# Altium footprint library Power_DiscreteSSR1.PcbLib: 45 footprints (part 2 of 3)
Each footprint in its own frame and in the unit in brackets; x right, y up, seen from the top. Pads: shape width x height; smd on the part's side, far side on the other; paste and mask are expansions set on the pad; w line width, h text height; cw(c..) or ccw(c..) is an arc to the next point about the centre after c.
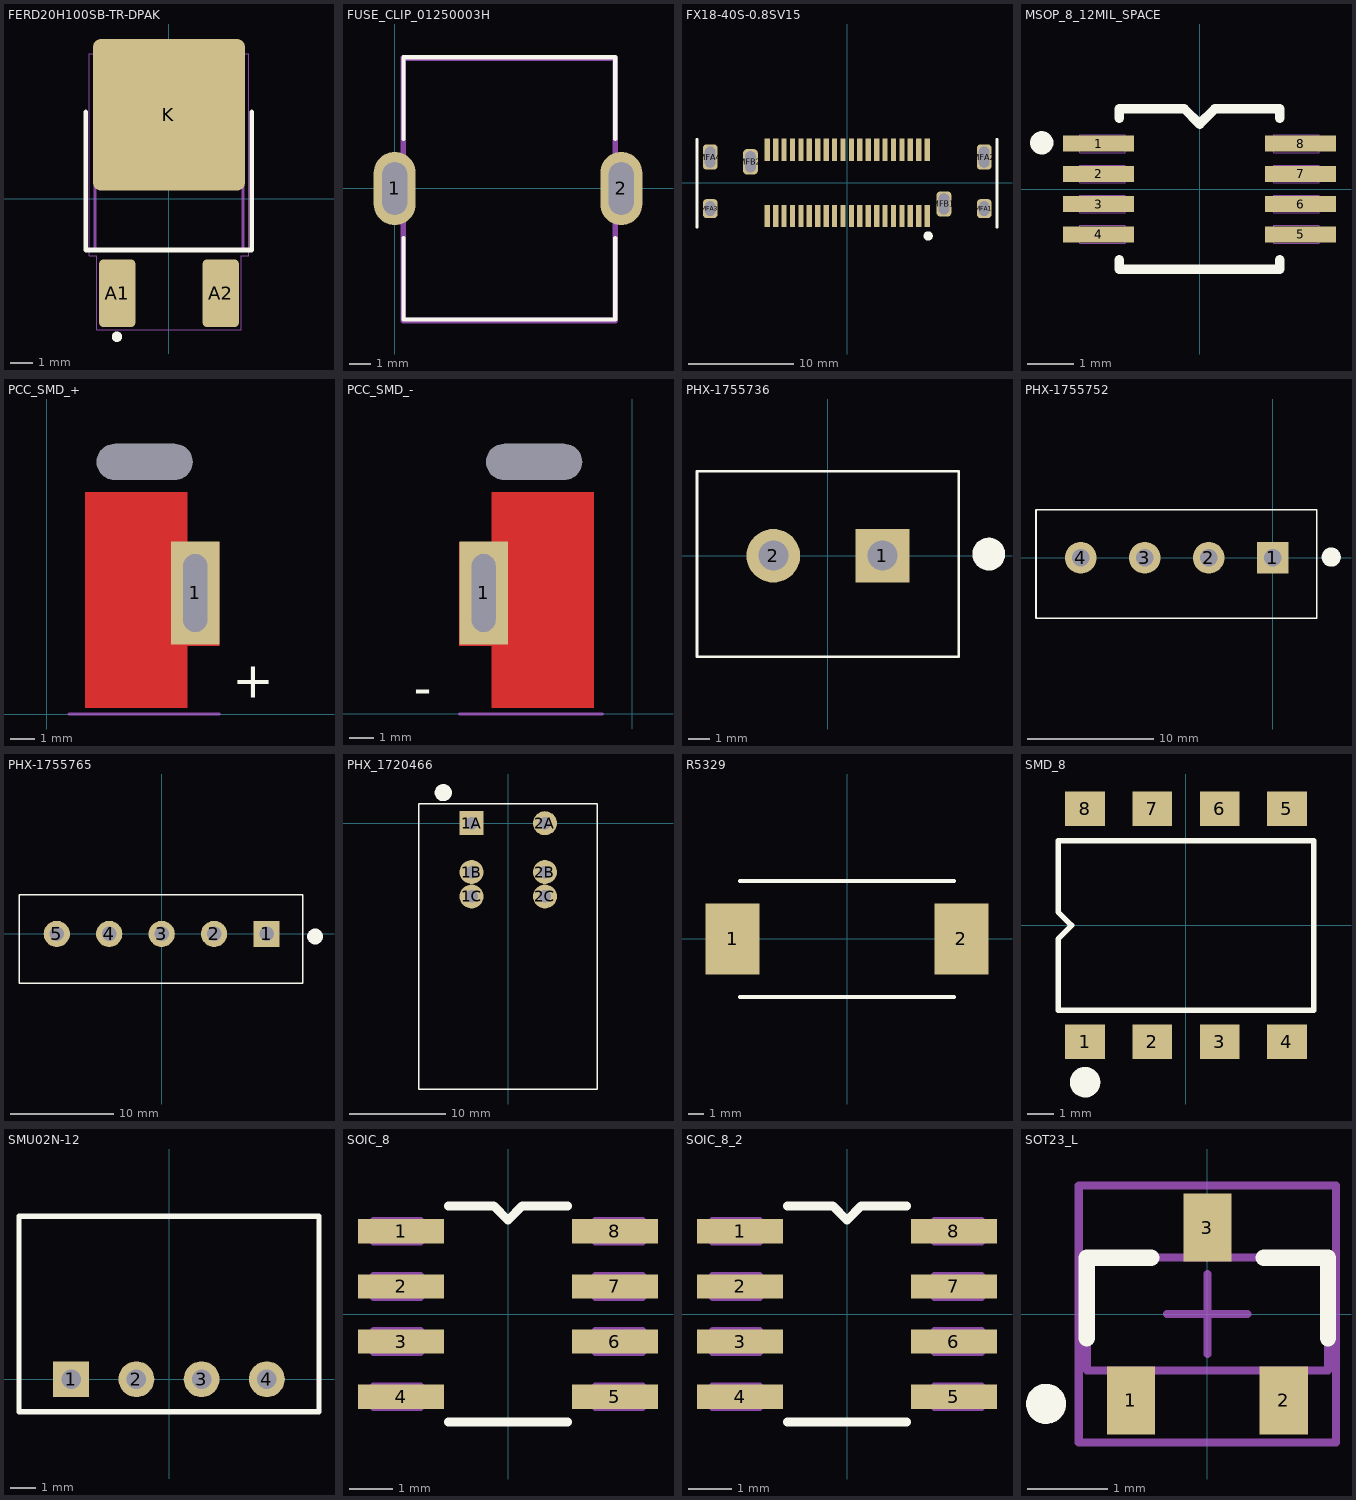
[diagram p1: the footprints below, top view; thin cyan lines are the x and y axes]

## FERD20H100SB-TR-DPAK [mm] "DIODE RECT 100V 20A DPAK"
pads (3):
  rrect25% 1.6x3 smd: A1(-2.286,-4.18) A2(2.286,-4.18)
  rrect10% 6.7x6.7 smd paste-4: K(0,3.7)
Top Overlay:
  circle w0.2: c-2.3,-6.1 r0.1
  circle w0.254: c-2.3,-6.1 r0.1
  lines w0.203: -3.683,3.825 -3.683,-2.27 3.658,-2.27 3.658,3.825
Top Paste:
  region: -0.53,3.15 -2.29,3.15 -2.29,5.03 -0.53,5.03
  region: 2.29,3.15 0.53,3.15 0.53,5.03 2.29,5.03
  region: -0.53,0.21 -2.29,0.21 -2.29,2.09 -0.53,2.09
  region: 2.29,0.21 0.53,0.21 0.53,2.09 2.29,2.09
Mechanical 13:
  circle w0.2: c-2.3,-6.1 r0.1
  lines w0.127: -3.27,-2.27 3.27,-2.27 3.27,3.825 -3.27,3.825 -3.27,-2.27
Mechanical 15:
  lines w0.05: -3.52,-2.52 -3.52,6.4 3.52,6.4 3.52,-2.52 3.2,-2.52 3.2,-5.8 -3.2,-5.8 -3.2,-2.52 -3.52,-2.52
3D body "FERD20H100SB-TR--3DModel-STEP-56544.STEP": height 2.4, standoff -0.23, extent -3.24,-4.375 3.3,5.5

## FUSE_CLIP_01250003H [mm]
pads (2):
  oval 2x3.5 hole 1.2 slot 2.5 at 90 deg: 1(0,0) 2(10.8,0)
Top Overlay:
  lines w0.203: 0.416,-2.362 0.416,-6.25 10.516,-6.25 10.516,-2.362 ; 0.416,2.362 0.416,6.25 10.516,6.25 10.516,2.362
Mechanical 15:
  lines w0.254: 0.413,-6.301 0.413,6.199 10.513,6.199 10.513,-6.301 0.413,-6.301 ; 0.413,-6.275 0.413,6.225 10.513,6.225 10.513,-6.275 0.413,-6.275
3D body: height 18.5, standoff 0, extent 0.406,-6.249 10.541,-3.208
3D body: height 3.5, standoff 0, extent 0.406,-6.248 10.516,6.248
3D body: height 18.5, standoff 0, extent 0.415,3.211 10.516,6.249

## FX18-40S-0.8SV15 [mm] "CONN RCPT 40POS SMD GOLD"
pads (46):
  rect 0.5x2.1 smd: 1(7.6,-3.15) 2(6.8,-3.15) 3(6,-3.15) 4(5.2,-3.15) 5(4.4,-3.15) 6(3.6,-3.15) 7(2.8,-3.15) 8(2,-3.15) 9(1.2,-3.15) 10(0.4,-3.15) 11(-0.4,-3.15) 12(-1.2,-3.15) 13(-2,-3.15) 14(-2.8,-3.15) 15(-3.6,-3.15) 16(-4.4,-3.15) 17(-5.2,-3.15) 18(-6,-3.15) 19(-6.8,-3.15) 20(-7.6,-3.15) 21(7.6,3.15) 22(6.8,3.15) 23(6,3.15) 24(5.2,3.15) 25(4.4,3.15) 26(3.6,3.15) 27(2.8,3.15) 28(2,3.15) 29(1.2,3.15) 30(0.4,3.15) 31(-0.4,3.15) 32(-1.2,3.15) 33(-2,3.15) 34(-2.8,3.15) 35(-3.6,3.15) 36(-4.4,3.15) 37(-5.2,3.15) 38(-6,3.15) 39(-6.8,3.15) 40(-7.6,3.15)
  rrect50% 1.4x1.8 hole 1.4 slot 1 at 0 deg: MFA1(13.025,-2.45) MFA3(-13.025,-2.45)
  rrect50% 1.4x2.4 hole 2 slot 1 at 0 deg: MFA2(13.025,2.45) MFA4(-13.025,2.45) MFB1(9.2,-2) MFB2(-9.2,2)
Top Overlay:
  circle w0.254: c7.7,-5.05 r0.1
  circle w0.254: c7.7,-5.05 r0.316
  lines w0.254: -14.28,-4.223 -14.28,4.159 ; 14.244,-4.223 14.244,4.159
3D body "FX18-40S-0.8SV15.stp": height 11.83, standoff -1.27, extent -13.95,-3.95 13.95,3.85

## MSOP_8_12MIL_SPACE [mil]
pads (8):
  rect 60x13.59 smd mask+3: 1(-85.5,38.39)
  rect 60x13.59 smd paste+0 mask+3: 2(-85.5,12.8) 3(-85.5,-12.8) 4(-85.5,-38.39) 5(85.5,-38.39) 6(85.5,-12.8) 7(85.5,12.8) 8(85.5,38.39)
Top Overlay:
  circle w9.84: c-133.58,39.11 r4.92
  lines w8: -68,-59.99 -68,-68 68,-68 68,-59.99 ; -68,59.99 -68,68 -13,68 0,55 13,68 68,68 68,59.99
Mechanical 13:
  lines w1: -101.5,-45.89 -101.5,-30.89 -63,-30.89 -63,-45.89 -101.5,-45.89 ; -101.5,-20.3 -101.5,-5.3 -63,-5.3 -63,-20.3 -101.5,-20.3 ; -101.5,5.3 -101.5,20.3 -63,20.3 -63,5.3 -101.5,5.3 ; -101.5,30.89 -101.5,45.89 -63,45.89 -63,30.89 -101.5,30.89 ; 63,-45.89 63,-30.89 101.5,-30.89 101.5,-45.89 63,-45.89 ; 63,-20.3 63,-5.3 101.5,-5.3 101.5,-20.3 63,-20.3 ; 63,5.3 63,20.3 101.5,20.3 101.5,5.3 63,5.3 ; 63,30.89 63,45.89 101.5,45.89 101.5,30.89 63,30.89
3D body "RM_8_ADI.step": height 43.11, standoff 0, extent -101.49,-62.99 101.5,63

## PCC_SMD_+ [mm] "Thermocouple connector"
height 2.286
pads (2):
  rect 2.032x4.318 hole 1 slot 3.25 at 90 deg: 1(6.2,5.05)
  rect 0x0 hole 1.5 slot 4 at 0 deg unplated paste-4 mask+0: 4(4.09,10.52)
Top Layer:
  region: 1.6,9.246 1.6,0.254 5.867,0.254 5.867,2.84 7.21,2.84 7.21,7.16 5.867,7.16 5.867,9.246
Top Overlay:
  text "+" at 7.747,0.686 h1.52
Mechanical 1:
  lines w0.127: 0.94,0 7.21,0
  text "R: 15.74mil (0.4mm) all" at 0.584,11.963 h1.02
  text "board edge" at 1.93,-1.651 h1.02
3D body: height 2.4, standoff 0, extent 1.626,-0.686 6.68,11.227

## PCC_SMD_- [mm] "Thermocouple connector"
height 2.286
pads (2):
  rect 2.032x4.318 hole 1 slot 3.25 at 90 deg: 1(-6.2,5.05)
  rect 0x0 hole 1.5 slot 4 at 0 deg unplated paste-4 mask+0: 3(-4.09,10.52)
Top Layer:
  region: -5.867,9.246 -1.6,9.246 -1.6,0.254 -5.867,0.254 -5.867,2.84 -7.21,2.84 -7.21,7.16 -5.867,7.16
Top Overlay:
  text "-" at -9.119,0.356 h1.52
Mechanical 1:
  lines w0.127: -7.214,0 -1.245,0
  text "R: 15.74mil (0.4mm) all" at -9.652,12.014 h1.02
  text "board edge" at -6.426,-1.6 h1.02
3D body: height 2.4, standoff 0, extent -6.68,-0.66 -1.626,11.227

## PHX-1755736 [mm] "TERM BLOCK HDR 2POS VERT 5.08MM"
pads (2):
  rect 2.5x2.5 hole 1.397 mask+0: 1(2.54,0)
  round 2.5 hole 1.397 mask+0: 2(-2.54,0)
Top Overlay:
  circle w0.762: c7.493,0.076 r0.381
  lines w0.127: -6.096,-4.699 6.096,-4.699 6.096,3.927 -6.096,3.927 -6.096,-4.699
3D body "1755736--3DModel-STEP-56544.STEP": height 12.15, standoff -4.1, extent -6.08,-4.666 6.08,3.904

## PHX-1755752 [mm] "TERM BLOCK HDR 4POS VERT 5.08MM"
pads (4):
  rect 2.5x2.5 hole 1.397 mask+0: 1(0,0)
  round 2.5 hole 1.397 mask+0: 2(-5.08,0) 3(-10.16,0) 4(-15.24,0)
Top Overlay:
  circle w0.762: c4.648,0.051 r0.381
  lines w0.127: -18.796,-4.801 -18.796,3.81 ; -18.787,-4.801 3.515,-4.801 3.515,3.81 -18.787,3.81
3D body "pxc_1755752_04_MSTBVA-2-5-4-G-5-08_3D.stp": height 12, standoff -3.9, extent -18.796,-4.79 3.524,3.81

## PHX-1755765 [mil] "TERM BLOCK HDR 5POS VERT 5.08MM"
pads (5):
  rect 100x100 / inner round 75 / far side round 75 hole 55 mask+0: 1(400,0)
  round 100 / inner round 75 / far side round 75 hole 55 mask+0: 2(200,0) 3(0,0) 4(-200,0) 5(-400,0)
Top Overlay:
  circle w30: c585,-10 r15
  lines w5: -544,-189 538.37,-189 538.37,150 -544,150 -544,-189
3D body "pxc_1755765_04_MSTBVA-2-5-5-G-5-08_3D.stp": height 472.44, standoff -153.54, extent -540.37,-188.79 538.37,149.79

## PHX_1720466 [mm]
pads (6):
  rect 2.5x2.5 hole 1.3 mask+0: 1A(-3.81,0)
  round 2.5 hole 1.3 mask+0: 1B(-3.81,-5.08) 1C(-3.81,-7.62) 2A(3.81,0) 2B(3.81,-5.08) 2C(3.81,-7.62)
Top Overlay:
  circle w1.016: c-6.756,3.175 r0.381
  lines w0.152: -9.322,-27.635 -9.322,2.032 9.271,2.032 9.271,-27.635 -9.322,-27.635
3D body "pxc_1720466_03_PC-5-2-G-7-62_3D.stp": height 15.12, standoff -4.09, extent -9.04,-27.462 9,1.788

## R5329 [mm]
pads (2):
  rect 3.4x4.5 smd: 1(-7.2,0) 2(7.2,0)
Top Overlay:
  lines w0.254: -6.75,-3.65 6.75,-3.65 ; -6.75,3.65 6.75,3.65
3D body "c-8-1879233-9-ba-3d.stp": height 6.9, standoff 0.1, extent -6.91,-3.65 6.71,3.65

## SMD_8 [mm]
pads (8):
  rect 1.5x1.3 smd: 1(-3.81,-4.4) 2(-1.27,-4.4) 3(1.27,-4.4) 4(3.81,-4.4) 5(3.81,4.4) 6(1.27,4.4) 7(-1.27,4.4) 8(-3.81,4.4)
Top Overlay:
  circle w0.635: c-3.81,-5.918 r0.257
  lines w0.203: -4.83,-3.2 4.83,-3.2 4.83,3.2 -4.83,3.2 -4.83,0.512 -4.318,0 -4.83,-0.512 -4.83,-3.2
3D body "G3VM_61FR1.step": height 4, standoff 0, extent -4.83,-5.006 4.83,4.994

## SMU02N-12 [mil]
pads (4):
  rect 55x55 hole 30: 1(-150,0)
  round 55 hole 30: 2(-50,0) 3(50,0) 4(150,0)
Top Overlay:
  lines w8: -230,-50 230,-50 230,250 -230,250 -230,-50
3D body: height 400, standoff 0, extent -230,-50 230,250

## SOIC_8 [mil]
pads (8):
  rect 78x22 smd: 1(-97,75) 2(-97,25) 3(-97,-25) 4(-97,-75) 5(97,-75) 6(97,-25) 7(97,25) 8(97,75)
Top Overlay:
  lines w8: -54,-98 54,-98 ; -54,98 -13,98 0,85 13,98 54,98
Mechanical 4:
  lines w0: -12,98 ccw(c0,98) 12,98 cw(c0,98) -12,98
  lines w6: -122,-85 -79,-85 ; -122,-85 -122,-65 ; -122,-85 -79,-85 ; -122,-85 -122,-65 ; -122,-65 -79,-65 ; -122,-65 -79,-65 ; -122,-35 -79,-35 ; -122,-35 -122,-15 ; -122,-35 -79,-35 ; -122,-35 -122,-15 ; -122,-15 -79,-15 ; -122,-15 -79,-15 ; -122,15 -79,15 ; -122,15 -122,35 ; -122,15 -79,15 ; -122,15 -122,35 ; -122,35 -79,35 ; -122,35 -79,35 ; -122,65 -79,65 ; -122,65 -122,85 ; -122,65 -79,65 ; -122,65 -122,85 ; -122,85 -79,85 ; -122,85 -79,85 ; -79,-85 -79,-65 ; -79,-85 -79,-65 ; -79,-35 -79,-15 ; -79,-35 -79,-15 ; -79,15 -79,35 ; -79,15 -79,35 ; -79,65 -79,85 ; -79,65 -79,85 ; 79,-85 122,-85 ; 79,-85 79,-65 ; 79,-85 122,-85 ; 79,-85 79,-65 ; 79,-65 122,-65 ; 79,-65 122,-65 ; 79,-35 122,-35 ; 79,-35 79,-15 ; 79,-35 122,-35 ; 79,-35 79,-15 ; 79,-15 122,-15 ; 79,-15 122,-15 ; 79,15 122,15 ; 79,15 79,35 ; 79,15 122,15 ; 79,15 79,35 ; 79,35 122,35 ; 79,35 122,35 ; 79,65 122,65 ; 79,65 79,85 ; 79,65 122,65 ; 79,65 79,85 ; 79,85 122,85 ; 79,85 122,85 ; 122,-85 122,-65 ; 122,-85 122,-65 ; 122,-35 122,-15 ; 122,-35 122,-15 ; 122,15 122,35 ; 122,15 122,35 ; 122,65 122,85 ; 122,65 122,85
3D body "ADUM5242ARZ-RL7.STEP": height 69.53, standoff 0.63, extent -118.11,-96.47 118.11,96.45

## SOIC_8_2 [mil]
pads (8):
  rect 78x22 smd: 1(-97,75) 2(-97,25) 3(-97,-25) 4(-97,-75) 5(97,-75) 6(97,-25) 7(97,25) 8(97,75)
Top Overlay:
  lines w8: -54,-98 54,-98 ; -54,98 -13,98 0,85 13,98 54,98
Mechanical 4:
  lines w0: -12,98 ccw(c0,98) 12,98 cw(c0,98) -12,98
  lines w6: -122,-85 -79,-85 ; -122,-85 -122,-65 ; -122,-85 -79,-85 ; -122,-85 -122,-65 ; -122,-65 -79,-65 ; -122,-65 -79,-65 ; -122,-35 -79,-35 ; -122,-35 -122,-15 ; -122,-35 -79,-35 ; -122,-35 -122,-15 ; -122,-15 -79,-15 ; -122,-15 -79,-15 ; -122,15 -79,15 ; -122,15 -122,35 ; -122,15 -79,15 ; -122,15 -122,35 ; -122,35 -79,35 ; -122,35 -79,35 ; -122,65 -79,65 ; -122,65 -122,85 ; -122,65 -79,65 ; -122,65 -122,85 ; -122,85 -79,85 ; -122,85 -79,85 ; -79,-85 -79,-65 ; -79,-85 -79,-65 ; -79,-35 -79,-15 ; -79,-35 -79,-15 ; -79,15 -79,35 ; -79,15 -79,35 ; -79,65 -79,85 ; -79,65 -79,85 ; 79,-85 122,-85 ; 79,-85 79,-65 ; 79,-85 122,-85 ; 79,-85 79,-65 ; 79,-65 122,-65 ; 79,-65 122,-65 ; 79,-35 122,-35 ; 79,-35 79,-15 ; 79,-35 122,-35 ; 79,-35 79,-15 ; 79,-15 122,-15 ; 79,-15 122,-15 ; 79,15 122,15 ; 79,15 79,35 ; 79,15 122,15 ; 79,15 79,35 ; 79,35 122,35 ; 79,35 122,35 ; 79,65 122,65 ; 79,65 79,85 ; 79,65 122,65 ; 79,65 79,85 ; 79,85 122,85 ; 79,85 122,85 ; 122,-85 122,-65 ; 122,-85 122,-65 ; 122,-35 122,-15 ; 122,-35 122,-15 ; 122,15 122,35 ; 122,15 122,35 ; 122,65 122,85 ; 122,65 122,85
3D body "ADUM5242ARZ-RL7.STEP": height 69.53, standoff 0.63, extent -118.11,-96.47 118.11,96.45

## SOT23_L [mm] "SOT23, 3-Leads, Body 2.9x1.3mm, Pitch 0.95mm, Lead Span 2.3mm - Reverse Pinning, IPC High Density"
height 1.1
pads (3):
  rect 0.6x0.85 smd: 1(-0.95,-1.075) 2(0.95,-1.075) 3(0,1.075)
Top Overlay:
  circle w0.25: c-2.007,-1.118 r0.125
  lines w0.203: -1.5,-0.3 -1.5,0.7 -0.7,0.7 ; 0.7,0.7 1.5,0.7 1.5,-0.3
Mechanical 13:
  lines w0.1: -1.5,-0.7 -1.5,0.7 1.5,0.7 1.5,-0.7 -1.5,-0.7
Mechanical 15:
  lines w0.1: -0.5,0 0.5,0 ; 0,-0.5 0,0.5 ; -1.6,-1.6 -1.6,1.6 1.6,1.6 1.6,-1.6 -1.6,-1.6
3D body: height 1.1, standoff 0, extent -1.5,-0.7 1.5,0.7